# Altium footprint library PR_COR.PcbLib: 73 footprints (part 3 of 5)
Each footprint in its own frame and in the unit in brackets; x right, y up, seen from the top. Pads: shape width x height; smd on the part's side, far side on the other; paste and mask are expansions set on the pad; w line width, h text height; cw(c..) or ccw(c..) is an arc to the next point about the centre after c.
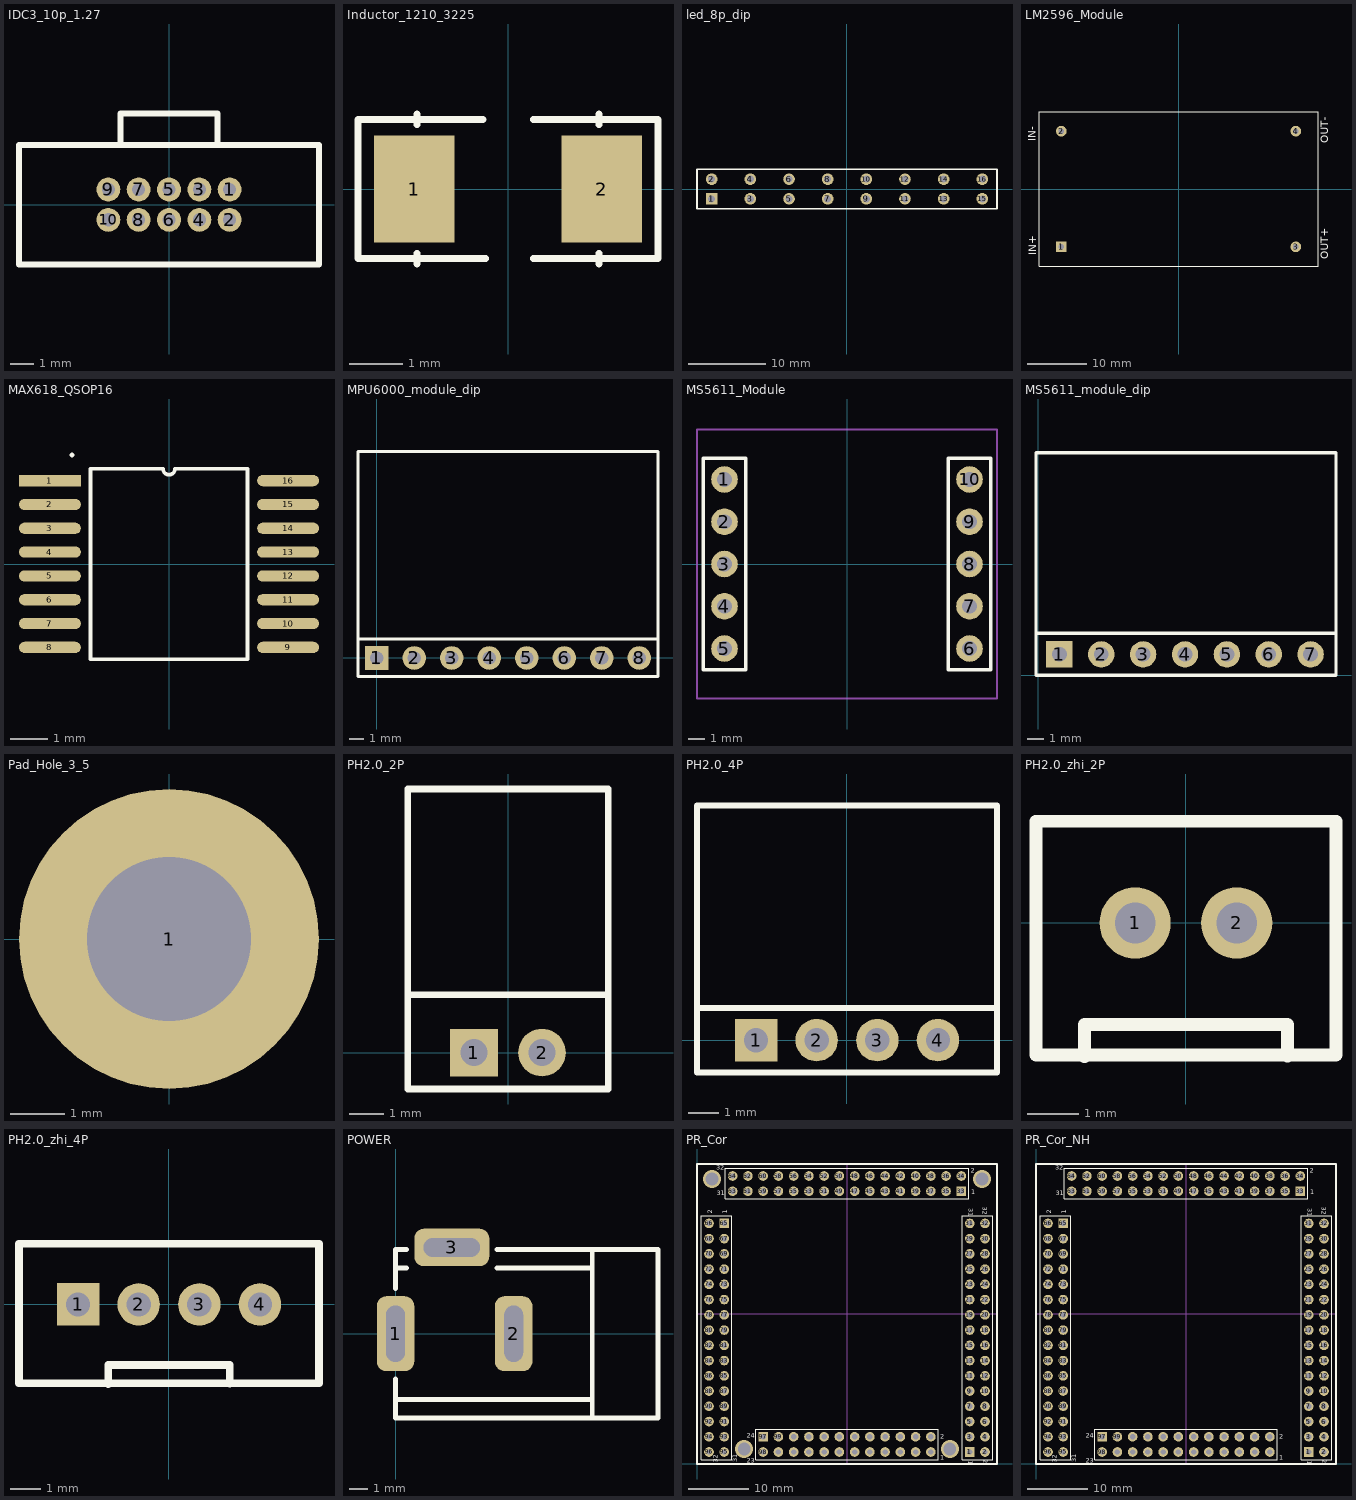
[diagram p2: the footprints below, top view; thin cyan lines are the x and y axes]

## IDC3_10p_1.27 [mm]
pads (10):
  round 1 hole 0.55: 1(2.54,0.635) 2(2.54,-0.635) 3(1.27,0.635) 4(1.27,-0.635) 5(0,0.635) 6(0,-0.635) 7(-1.27,0.635) 8(-1.27,-0.635) 9(-2.54,0.635) 10(-2.54,-0.635)
Top Overlay:
  lines w0.254: -2.032,2.54 -2.032,3.81 2.032,3.81 2.032,2.54 ; -6.28,-2.5 6.28,-2.5 6.28,2.5 -6.28,2.5 -6.28,-2.5

## Inductor_1210_3225 [mm]
height 1
pads (2):
  rect 1.5x2 smd: 1(-1.75,0) 2(1.75,0)
Top Overlay:
  lines w0.127: -1.7,-1.4 -1.7,-1.2 ; -1.7,1.2 -1.7,1.4 ; -0.466,1.3 -2.8,1.3 -2.8,-1.3 -0.416,-1.3 ; 0.47,-1.3 2.8,-1.3 2.8,1.3 0.47,1.3 ; 1.7,-1.4 1.7,-1.2 ; 1.7,1.2 1.7,1.4
3D body: height 2.27, standoff 0.02, extent -1.65,-1.25 1.65,1.25

## led_8p_dip [mm] "Connector; Header; 12x2 Position"
pads (16):
  rect 1.5x1.5 hole 0.9: 1(-17.5,-1.27)
  round 1.5 hole 0.9: 2(-17.5,1.27) 3(-12.5,-1.27) 4(-12.5,1.27) 5(-7.5,-1.27) 6(-7.5,1.27) 7(-2.5,-1.27) 8(-2.5,1.27) 9(2.5,-1.27) 10(2.5,1.27) 11(7.5,-1.27) 12(7.5,1.27) 13(12.5,-1.27) 14(12.5,1.27) 15(17.5,-1.27) 16(17.5,1.27)
Top Overlay:
  lines w0.2: -19.4,-2.54 19.4,-2.54 19.4,2.54 -19.4,2.54 -19.4,-2.54
3D body: height 5.22, standoff -2.98, extent -19.4,-1.9 -15.6,1.9
3D body: height 5.22, standoff -2.98, extent -14.4,-1.9 -10.6,1.9
3D body: height 5.22, standoff -2.98, extent -9.4,-1.9 -5.6,1.9
3D body: height 5.22, standoff -2.98, extent -4.4,-1.9 -0.6,1.9
3D body: height 5.22, standoff -2.98, extent 0.6,-1.9 4.4,1.9
3D body: height 5.22, standoff -2.98, extent 5.6,-1.9 9.4,1.9
3D body: height 5.22, standoff -2.98, extent 10.6,-1.9 14.4,1.9
3D body: height 5.22, standoff -2.98, extent 15.6,-1.9 19.4,1.9

## LM2596_Module [mm] "Connector; Header; 12x2 Position"
pads (4):
  rect 1.8x1.8 hole 0.9: 1(-19.75,-9.75)
  round 1.8 hole 0.9: 2(-19.75,9.75) 3(19.75,-9.75) 4(19.75,9.75)
Top Overlay:
  lines w0.2: -23.5,-13 23.5,-13 23.5,13 -23.5,13 -23.5,-13
  text "OUT-" at 25.24,7.74 h1.27
  text "OUT+" at 25.24,-11.84 h1.27
  text "IN-" at -24.01,8 h1.27
  text "IN+" at -24.01,-11.17 h1.27
3D body: height 16.16, standoff -2.98, extent -23.5,-13 23.5,13

## MAX618_QSOP16 [mm]
pads (16):
  rect 1.65x0.3 smd: 1(-3.175,2.222)
  oval 1.65x0.3 smd: 2(-3.175,1.587) 3(-3.175,0.953) 4(-3.175,0.318) 5(-3.175,-0.318) 6(-3.175,-0.953) 7(-3.175,-1.587) 8(-3.175,-2.222) 9(3.175,-2.222) 10(3.175,-1.587) 11(3.175,-0.953) 12(3.175,-0.318) 13(3.175,0.318) 14(3.175,0.953) 15(3.175,1.587) 16(3.175,2.222)
Top Overlay:
  lines w0.1: -2.09,-2.54 -2.09,2.54 -0.159,2.54 ccw(c0,2.54) 0.159,2.54 2.09,2.54 2.09,-2.54 -2.09,-2.54
  lines w0.127: -2.59,2.91 -2.58,2.91
3D body: height 0.97, standoff 0.02, extent -3,-2.45 3,2.45

## MPU6000_module_dip [mm] "Connector; Header; 8 Position"
pads (8):
  rect 1.6x1.6 hole 0.9: 1(0,0)
  round 1.6 hole 0.9: 2(2.54,0) 3(5.08,0) 4(7.62,0) 5(10.16,0) 6(12.7,0) 7(15.24,0) 8(17.78,0)
Top Overlay:
  lines w0.2: -1.27,1.27 -1.27,14 19.05,14 19.05,1.27 ; -1.27,1.27 -1.27,-1.27 19.05,-1.27 19.05,1.27 ; -1.27,1.27 19.05,1.27

## MS5611_Module [mm] "Connector; Header; 5 Position"
pads (10):
  round 1.6 hole 0.9: 1(-7.366,5.08) 2(-7.366,2.54) 3(-7.366,0) 4(-7.366,-2.54) 5(-7.366,-5.08) 6(7.366,-5.08) 7(7.366,-2.54) 8(7.366,0) 9(7.366,2.54) 10(7.366,5.08)
Top Overlay:
  lines w0.2: -8.636,-6.35 -8.636,6.35 -6.096,6.35 -6.096,-6.35 -8.636,-6.35 ; 6.096,-6.35 8.636,-6.35 8.636,6.35 6.096,6.35 6.096,-6.35
Mechanical 2:
  lines w0.127: -9.017,-8.077 9.017,-8.077 9.017,8.077 -9.017,8.077 -9.017,-8.077

## MS5611_module_dip [mm] "Connector; Header; 8 Position"
pads (7):
  rect 1.6x1.6 hole 0.9: 1(1.27,1.27)
  round 1.6 hole 0.9: 2(3.81,1.27) 3(6.35,1.27) 4(8.89,1.27) 5(11.43,1.27) 6(13.97,1.27) 7(16.51,1.27)
Top Overlay:
  lines w0.2: 18.05,2.54 -0.15,2.54 ; -0.15,2.54 -0.15,0 18.05,0 18.05,13.5 -0.15,13.5 -0.15,2.54

## Pad_Hole_3_5 [mm]
pads (1):
  round 5.5 hole 3: 1(0,0)

## PH2.0_2P [mm] "Connector; Header; 4 Position"
pads (2):
  rect 1.4x1.4 hole 0.8: 1(-1,0)
  round 1.4 hole 0.8: 2(1,0)
Top Overlay:
  lines w0.2: -2.95,1.7 2.95,1.7 ; -2.95,-1.07 2.95,-1.07 2.95,7.75 -2.95,7.75 -2.95,-1.07
3D body: height 4.62, standoff -2.98, extent -2.95,-0.22 2.95,7.78

## PH2.0_4P [mm] "Connector; Header; 4 Position"
pads (4):
  rect 1.4x1.4 hole 0.8: 1(-3,0)
  round 1.4 hole 0.8: 2(-1,0) 3(1,0) 4(3,0)
Top Overlay:
  lines w0.2: -4.95,1.07 4.95,1.07 ; -4.95,-1.07 4.95,-1.07 4.95,7.75 -4.95,7.75 -4.95,-1.07
3D body: height 4.62, standoff -2.98, extent -4.95,-0.25 4.95,7.75

## PH2.0_zhi_2P [mm] "Connector; Header; 4 Position"
pads (2):
  round 1.4 hole 0.8: 1(-1,0) 2(1,0)
Top Overlay:
  lines w0.254: -2,-2.63 -2,-2 2,-2 2,-2.62 ; -2.95,-2.6 -2.95,2 2.95,2 2.95,-2.6 -2.95,-2.6
3D body: height 6.02, standoff -3.38, extent -2.95,-2.6 2.95,2

## PH2.0_zhi_4P [mm] "Connector; Header; 4 Position"
pads (4):
  rect 1.4x1.4 hole 0.8: 1(-3,0)
  round 1.4 hole 0.8: 2(-1,0) 3(1,0) 4(3,0)
Top Overlay:
  lines w0.254: -2,-2.63 -2,-2 2,-2 2,-2.62 ; -4.95,-2.6 -4.95,2 4.95,2 4.95,-2.6 -4.95,-2.6
3D body: height 6.02, standoff -3.38, extent -4.95,-2.6 4.95,2

## POWER [mm]
pads (3):
  rrect50% 2x4 hole 1 slot 3 at 90 deg: 1(0,0) 2(6.3,0)
  rrect50% 4x2 hole 1 slot 3 at 0 deg: 3(3,4.6)
Top Overlay:
  lines w0.254: 0,-3.505 10.49,-3.505 ; 0,-2.4 0,-4.496 13.995,-4.496 13.995,4.496 5.4,4.496 ; 0,2.4 0,4.496 0.6,4.496 ; 0,3.505 0.6,3.505 ; 5.4,3.505 10.49,3.505 ; 10.49,-4.496 10.49,4.496
3D body: height 11.02, standoff -3.48, extent -0.043,-4.503 13.783,5.003

## PR_Cor [mm]
pads (120):
  rect 1.6x1.6 hole 0.9: 1(45.46,2) 33(44.05,45.46) 65(4.54,40.1) 97(11.03,4.54)
  round 1.6 hole 0.9: 2(48,2) 3(45.46,4.54) 4(48,4.54) 5(45.46,7.08) 6(48,7.08) 7(45.46,9.62) 8(48,9.62) 9(45.46,12.16) 10(48,12.16) 11(45.46,14.7) 12(48,14.7) 13(45.46,17.24) 14(48,17.24) 15(45.46,19.78) 16(48,19.78) 17(45.46,22.32) 18(48,22.32) 19(45.46,24.86) 20(48,24.86) 21(45.46,27.4) 22(48,27.4) 23(45.46,29.94) 24(48,29.94) 25(45.46,32.48) 26(48,32.48) 27(45.46,35.02) 28(48,35.02) 29(45.46,37.56) 30(48,37.56) 31(45.46,40.1) 32(48,40.1) 34(44.05,48) 35(41.51,45.46) 36(41.51,48) 37(38.97,45.46) 38(38.97,48) 39(36.43,45.46) 40(36.43,48) 41(33.89,45.46) 42(33.89,48) 43(31.35,45.46) 44(31.35,48) 45(28.81,45.46) 46(28.81,48) 47(26.27,45.46) 48(26.27,48) 49(23.73,45.46) 50(23.73,48) 51(21.19,45.46) 52(21.19,48) 53(18.65,45.46) 54(18.65,48) 55(16.11,45.46) 56(16.11,48) 57(13.57,45.46) 58(13.57,48) 59(11.03,45.46) 60(11.03,48) 61(8.49,45.46) 62(8.49,48) 63(5.95,45.46) 64(5.95,48) 66(2,40.1) 67(4.54,37.56) 68(2,37.56) 69(4.54,35.02) 70(2,35.02) 71(4.54,32.48) 72(2,32.48) 73(4.54,29.94) 74(2,29.94) 75(4.54,27.4) 76(2,27.4) 77(4.54,24.86) 78(2,24.86) 79(4.54,22.32) 80(2,22.32) 81(4.54,19.78) 82(2,19.78) 83(4.54,17.24) 84(2,17.24) 85(4.54,14.7) 86(2,14.7) 87(4.54,12.16) 88(2,12.16) 89(4.54,9.62) 90(2,9.62) 91(4.54,7.08) 92(2,7.08) 93(4.54,4.54) 94(2,4.54) 95(4.54,2) 96(2,2) 98(11.03,2) 99(13.57,4.54) 100(13.57,2) 101(16.11,4.54) 102(16.11,2) 103(18.65,4.54) 104(18.65,2) 105(21.19,4.54) 106(21.19,2) 107(23.73,4.54) 108(23.73,2) 109(26.27,4.54) 110(26.27,2) 111(28.81,4.54) 112(28.81,2) 113(31.35,4.54) 114(31.35,2) 115(33.89,4.54) 116(33.89,2) 117(36.43,4.54) 118(36.43,2) 119(38.97,4.54) 120(38.97,2)
via 42.15,2.5 diameter 3 hole 2.1
via 7.85,2.5 diameter 3 hole 2.1
via 2.5,47.5 diameter 3 hole 2.1
via 47.5,47.5 diameter 3 hole 2.1
Top Overlay:
  lines w0.2: 0.73,0.73 5.81,0.73 5.81,41.37 0.73,41.37 0.73,0.73 ; 4.68,44.19 45.32,44.19 45.32,49.27 4.68,49.27 4.68,44.19 ; 9.76,0.73 40.24,0.73 40.24,5.81 9.76,5.81 9.76,0.73 ; 44.19,0.73 49.27,0.73 49.27,41.37 44.19,41.37 44.19,0.73
  lines w0.254: 0,0 0,50 50,50 50,0 0,0
  text "24" at 8.28,4.36 h0.76
  text "23" at 8.26,0.24 h0.76
  text "2" at 40.57,4.2 h0.76
  text "1" at 40.52,0.67 h0.76
  text "32" at 47.63,42.85 h0.76
  text "31" at 45.29,42.6 h0.76
  text "1" at 45.2,0.51 h0.76
  text "2" at 47.73,0.78 h0.76
  text "2" at 45.61,48.55 h0.76
  text "1" at 45.68,44.96 h0.76
  text "31" at 3.29,44.77 h0.76
  text "32" at 3.17,49.03 h0.76
  text "32" at 3.49,0.23 h0.76
  text "31" at 6.71,0.3 h0.76
  text "1" at 5.04,41.73 h0.76
  text "2" at 2.51,41.71 h0.76
Bottom Overlay:
  lines w0.2: 0.73,0.73 0.73,41.37 5.81,41.37 5.81,0.73 0.73,0.73 ; 4.68,44.19 4.68,49.27 45.32,49.27 45.32,44.19 4.68,44.19 ; 9.76,0.73 9.76,5.81 40.24,5.81 40.24,0.73 9.76,0.73 ; 44.19,0.73 44.19,41.37 49.27,41.37 49.27,0.73 44.19,0.73
  text "1" at 40.74,0.62 h0.76
  text "2" at 41.07,4.2 h0.76
  text "23" at 9.56,0.23 h0.76
  text "24" at 9.49,4.38 h0.76
  text "2" at 47.8,0.28 h0.76
  text "1" at 45.21,0.29 h0.76
  text "31" at 45.3,41.62 h0.76
  text "32" at 47.61,41.61 h0.76
  text "32" at 4.45,49.03 h0.76
  text "31" at 4.34,44.66 h0.76
  text "1" at 45.91,44.96 h0.76
  text "2" at 46.07,48.54 h0.76
  text "2" at 2.508,42.19 h0.76
  text "1" at 5.04,41.96 h0.76
  text "31" at 6.7,1.29 h0.76
  text "32" at 3.46,1.55 h0.76
Mechanical 2:
  lines w0.127: 0,25 50,25 ; 25,0 25,50
3D body: height 7.12, standoff -2.58, extent 4.68,44.19 45.32,49.27
3D body: height 7.12, standoff -2.58, extent 44.19,0.73 49.27,41.37
3D body: height 7.12, standoff -2.58, extent 0.73,0.73 5.81,41.37
3D body: height 7.12, standoff -2.58, extent 9.76,0.73 40.24,5.81

## PR_Cor_NH [mm]
pads (120):
  rect 1.6x1.6 hole 0.9: 1(45.46,2) 33(44.05,45.46) 65(4.54,40.1) 97(11.03,4.54)
  round 1.6 hole 0.9: 2(48,2) 3(45.46,4.54) 4(48,4.54) 5(45.46,7.08) 6(48,7.08) 7(45.46,9.62) 8(48,9.62) 9(45.46,12.16) 10(48,12.16) 11(45.46,14.7) 12(48,14.7) 13(45.46,17.24) 14(48,17.24) 15(45.46,19.78) 16(48,19.78) 17(45.46,22.32) 18(48,22.32) 19(45.46,24.86) 20(48,24.86) 21(45.46,27.4) 22(48,27.4) 23(45.46,29.94) 24(48,29.94) 25(45.46,32.48) 26(48,32.48) 27(45.46,35.02) 28(48,35.02) 29(45.46,37.56) 30(48,37.56) 31(45.46,40.1) 32(48,40.1) 34(44.05,48) 35(41.51,45.46) 36(41.51,48) 37(38.97,45.46) 38(38.97,48) 39(36.43,45.46) 40(36.43,48) 41(33.89,45.46) 42(33.89,48) 43(31.35,45.46) 44(31.35,48) 45(28.81,45.46) 46(28.81,48) 47(26.27,45.46) 48(26.27,48) 49(23.73,45.46) 50(23.73,48) 51(21.19,45.46) 52(21.19,48) 53(18.65,45.46) 54(18.65,48) 55(16.11,45.46) 56(16.11,48) 57(13.57,45.46) 58(13.57,48) 59(11.03,45.46) 60(11.03,48) 61(8.49,45.46) 62(8.49,48) 63(5.95,45.46) 64(5.95,48) 66(2,40.1) 67(4.54,37.56) 68(2,37.56) 69(4.54,35.02) 70(2,35.02) 71(4.54,32.48) 72(2,32.48) 73(4.54,29.94) 74(2,29.94) 75(4.54,27.4) 76(2,27.4) 77(4.54,24.86) 78(2,24.86) 79(4.54,22.32) 80(2,22.32) 81(4.54,19.78) 82(2,19.78) 83(4.54,17.24) 84(2,17.24) 85(4.54,14.7) 86(2,14.7) 87(4.54,12.16) 88(2,12.16) 89(4.54,9.62) 90(2,9.62) 91(4.54,7.08) 92(2,7.08) 93(4.54,4.54) 94(2,4.54) 95(4.54,2) 96(2,2) 98(11.03,2) 99(13.57,4.54) 100(13.57,2) 101(16.11,4.54) 102(16.11,2) 103(18.65,4.54) 104(18.65,2) 105(21.19,4.54) 106(21.19,2) 107(23.73,4.54) 108(23.73,2) 109(26.27,4.54) 110(26.27,2) 111(28.81,4.54) 112(28.81,2) 113(31.35,4.54) 114(31.35,2) 115(33.89,4.54) 116(33.89,2) 117(36.43,4.54) 118(36.43,2) 119(38.97,4.54) 120(38.97,2)
Top Overlay:
  lines w0.2: 0.73,0.73 5.81,0.73 5.81,41.37 0.73,41.37 0.73,0.73 ; 4.68,44.19 45.32,44.19 45.32,49.27 4.68,49.27 4.68,44.19 ; 9.76,0.73 40.24,0.73 40.24,5.81 9.76,5.81 9.76,0.73 ; 44.19,0.73 49.27,0.73 49.27,41.37 44.19,41.37 44.19,0.73
  lines w0.254: 0,0 0,50 50,50 50,0 0,0
  text "24" at 8.28,4.36 h0.76
  text "23" at 8.26,0.24 h0.76
  text "2" at 40.57,4.2 h0.76
  text "1" at 40.52,0.67 h0.76
  text "32" at 47.63,42.85 h0.76
  text "31" at 45.29,42.6 h0.76
  text "1" at 45.2,0.51 h0.76
  text "2" at 47.73,0.78 h0.76
  text "2" at 45.61,48.55 h0.76
  text "1" at 45.68,44.96 h0.76
  text "31" at 3.29,44.77 h0.76
  text "32" at 3.17,49.03 h0.76
  text "32" at 3.49,0.23 h0.76
  text "31" at 6.71,0.3 h0.76
  text "1" at 5.04,41.73 h0.76
  text "2" at 2.51,41.71 h0.76
Bottom Overlay:
  lines w0.2: 0.73,0.73 0.73,41.37 5.81,41.37 5.81,0.73 0.73,0.73 ; 4.68,44.19 4.68,49.27 45.32,49.27 45.32,44.19 4.68,44.19 ; 9.76,0.73 9.76,5.81 40.24,5.81 40.24,0.73 9.76,0.73 ; 44.19,0.73 44.19,41.37 49.27,41.37 49.27,0.73 44.19,0.73
  text "1" at 40.74,0.62 h0.76
  text "2" at 41.07,4.2 h0.76
  text "23" at 9.56,0.23 h0.76
  text "24" at 9.49,4.38 h0.76
  text "2" at 47.8,0.28 h0.76
  text "1" at 45.21,0.29 h0.76
  text "31" at 45.3,41.62 h0.76
  text "32" at 47.61,41.61 h0.76
  text "32" at 4.45,49.03 h0.76
  text "31" at 4.34,44.66 h0.76
  text "1" at 45.91,44.96 h0.76
  text "2" at 46.07,48.54 h0.76
  text "2" at 2.508,42.19 h0.76
  text "1" at 5.04,41.96 h0.76
  text "31" at 6.7,1.29 h0.76
  text "32" at 3.46,1.55 h0.76
Mechanical 2:
  lines w0.127: 0,25 50,25 ; 25,0 25,50
3D body: height 13.02, standoff 0.79, extent 0,0 50,50
3D body: height 7.12, standoff -2.58, extent 4.68,44.19 45.32,49.27
3D body: height 7.12, standoff -2.58, extent 44.19,0.73 49.27,41.37
3D body: height 7.12, standoff -2.58, extent 0.73,0.73 5.81,41.37
3D body: height 7.12, standoff -2.58, extent 9.76,0.73 40.24,5.81